# Altium footprint library con-amp.PCBLIB: 295 footprints (part 13 of 19)
Each footprint in its own frame and in the unit in brackets; x right, y up, seen from the top. Pads: shape width x height; smd on the part's side, far side on the other; paste and mask are expansions set on the pad; w line width, h text height; cw(c..) or ccw(c..) is an arc to the next point about the centre after c.
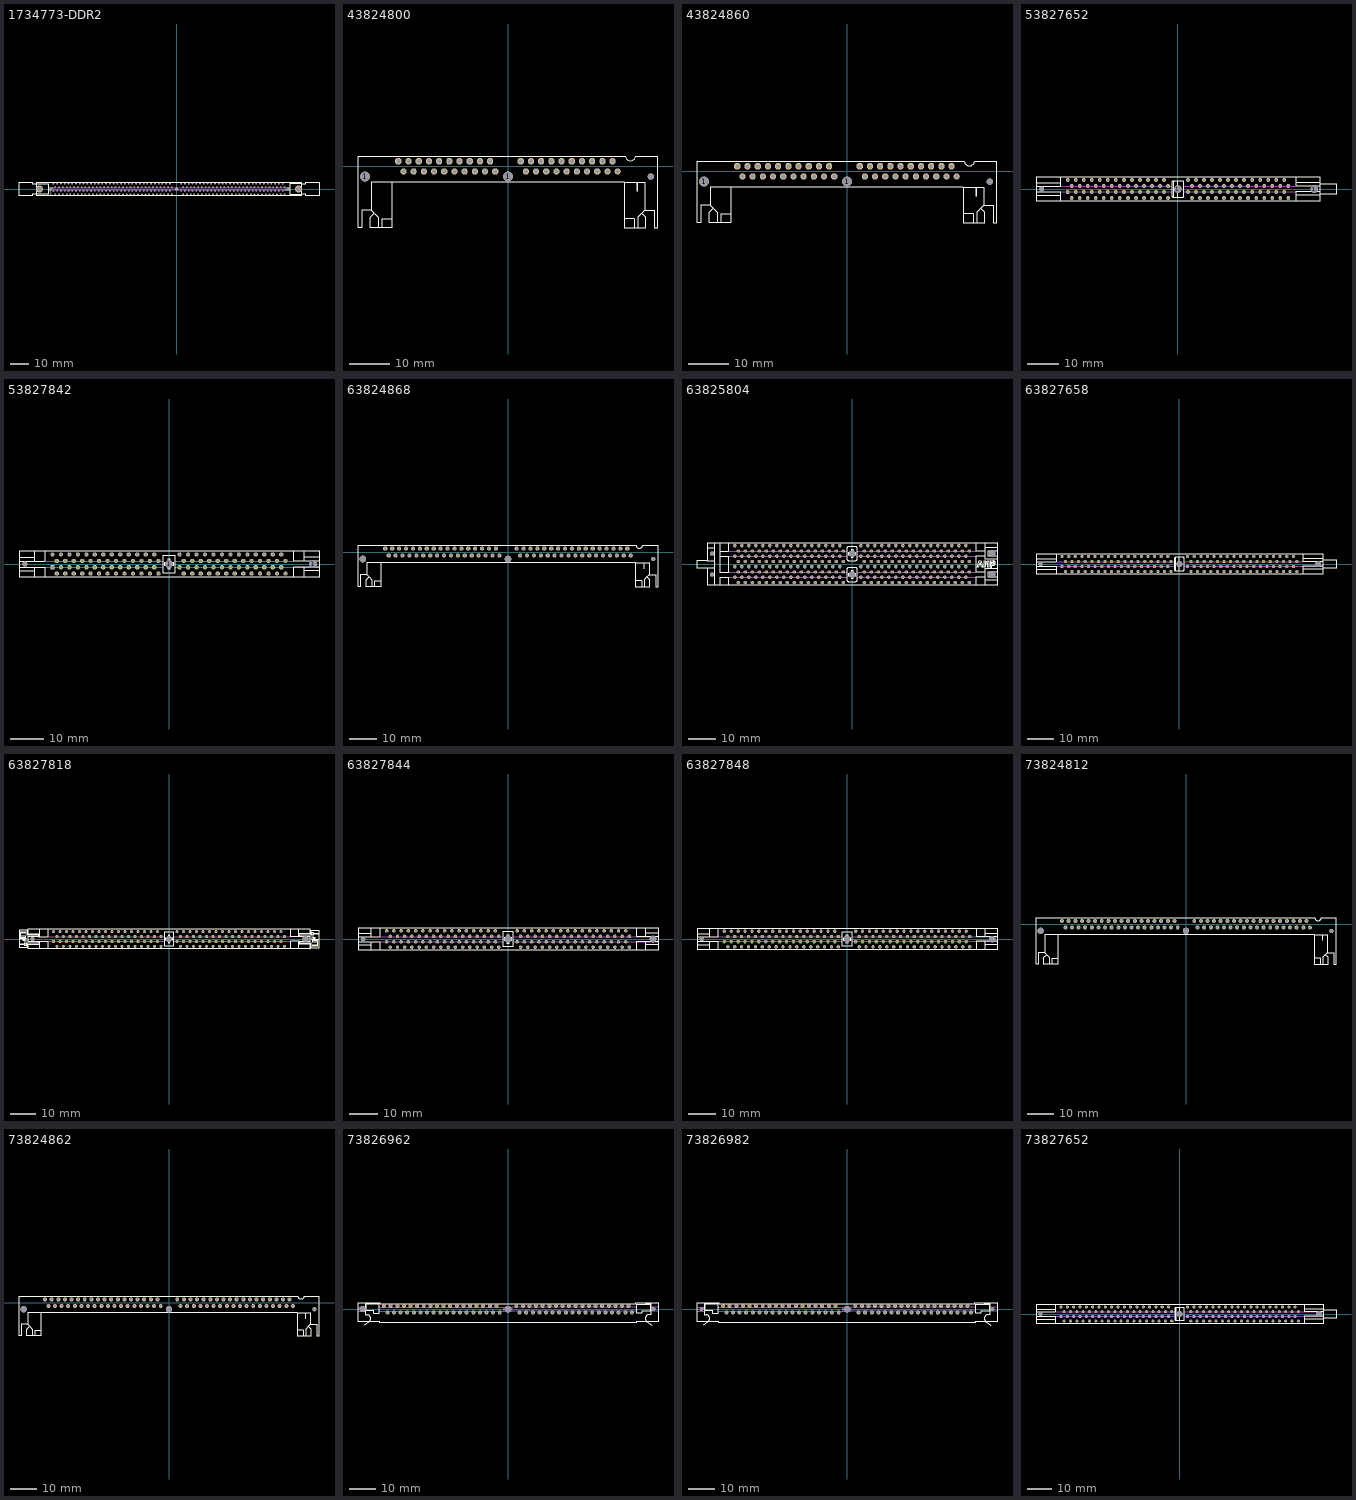
[diagram p12: the footprints below, top view; thin cyan lines are the x and y axes]

## 1734773-DDR2 [mm]
pads (243):
  round 0.9 hole 0.5: 1(-64.5,-2.85) 2(-65.5,-0.95) 3(-62.5,-2.85) 4(-63.5,-0.95) 5(-60.5,-2.85) 6(-61.5,-0.95) 7(-58.5,-2.85) 8(-59.5,-0.95) 9(-56.5,-2.85) 10(-57.5,-0.95) 11(-54.5,-2.85) 12(-55.5,-0.95) 13(-52.5,-2.85) 14(-53.5,-0.95) 15(-50.5,-2.85) 16(-51.5,-0.95) 17(-48.5,-2.85) 18(-49.5,-0.95) 19(-46.5,-2.85) 20(-47.5,-0.95) 21(-44.5,-2.85) 22(-45.5,-0.95) 23(-42.5,-2.85) 24(-43.5,-0.95) 25(-40.5,-2.85) 26(-41.5,-0.95) 27(-38.5,-2.85) 28(-39.5,-0.95) 29(-36.5,-2.85) 30(-37.5,-0.95) 31(-34.5,-2.85) 32(-35.5,-0.95) 33(-32.5,-2.85) 34(-33.5,-0.95) 35(-30.5,-2.85) 36(-31.5,-0.95) 37(-28.5,-2.85) 38(-29.5,-0.95) 39(-26.5,-2.85) 40(-27.5,-0.95) 41(-24.5,-2.85) 42(-25.5,-0.95) 43(-22.5,-2.85) 44(-23.5,-0.95) 45(-20.5,-2.85) 46(-21.5,-0.95) 47(-18.5,-2.85) 48(-19.5,-0.95) 49(-16.5,-2.85) 50(-17.5,-0.95) 51(-14.5,-2.85) 52(-15.5,-0.95) 53(-12.5,-2.85) 54(-13.5,-0.95) 55(-10.5,-2.85) 56(-11.5,-0.95) 57(-8.5,-2.85) 58(-9.5,-0.95) 59(-6.5,-2.85) 60(-7.5,-0.95) 61(-4.5,-2.85) 62(-5.5,-0.95) 63(-2.5,-2.85) 64(-3.5,-0.95) 65(3.5,-2.85) 66(2.5,-0.95) 67(5.5,-2.85) 68(4.5,-0.95) 69(7.5,-2.85) 70(6.5,-0.95) 71(9.5,-2.85) 72(8.5,-0.95) 73(11.5,-2.85) 74(10.5,-0.95) 75(13.5,-2.85) 76(12.5,-0.95) 77(15.5,-2.85) 78(14.5,-0.95) 79(17.5,-2.85) 80(16.5,-0.95) 81(19.5,-2.85) 82(18.5,-0.95) 83(21.5,-2.85) 84(20.5,-0.95) 85(23.5,-2.85) 86(22.5,-0.95) 87(25.5,-2.85) 88(24.5,-0.95) 89(27.5,-2.85) 90(26.5,-0.95) 91(29.5,-2.85) 92(28.5,-0.95) 93(31.5,-2.85) 94(30.5,-0.95) 95(33.5,-2.85) 96(32.5,-0.95) 97(35.5,-2.85) 98(34.5,-0.95) 99(37.5,-2.85) 100(36.5,-0.95) 101(39.5,-2.85) 102(38.5,-0.95) 103(41.5,-2.85) 104(40.5,-0.95) 105(43.5,-2.85) 106(42.5,-0.95) 107(45.5,-2.85) 108(44.5,-0.95) 109(47.5,-2.85) 110(46.5,-0.95) 111(49.5,-2.85) 112(48.5,-0.95) 113(51.5,-2.85) 114(50.5,-0.95) 115(53.5,-2.85) 116(52.5,-0.95) 117(55.5,-2.85) 118(54.5,-0.95) 119(57.5,-2.85) 120(56.5,-0.95) 121(-64.5,0.95) 122(-65.5,2.85) 123(-62.5,0.95) 124(-63.5,2.85) 125(-60.5,0.95) 126(-61.5,2.85) 127(-58.5,0.95) 128(-59.5,2.85) 129(-56.5,0.95) 130(-57.5,2.85) 131(-54.5,0.95) 132(-55.5,2.85) 133(-52.5,0.95) 134(-53.5,2.85) 135(-50.5,0.95) 136(-51.5,2.85) 137(-48.5,0.95) 138(-49.5,2.85) 139(-46.5,0.95) 140(-47.5,2.85) 141(-44.5,0.95) 142(-45.5,2.85) 143(-42.5,0.95) 144(-43.5,2.85) 145(-40.5,0.95) 146(-41.5,2.85) 147(-38.5,0.95) 148(-39.5,2.85) 149(-36.5,0.95) 150(-37.5,2.85) 151(-34.5,0.95) 152(-35.5,2.85) 153(-32.5,0.95) 154(-33.5,2.85) 155(-30.5,0.95) 156(-31.5,2.85) 157(-28.5,0.95) 158(-29.5,2.85) 159(-26.5,0.95) 160(-27.5,2.85) 161(-24.5,0.95) 162(-25.5,2.85) 163(-22.5,0.95) 164(-23.5,2.85) 165(-20.5,0.95) 166(-21.5,2.85) 167(-18.5,0.95) 168(-19.5,2.85) 169(-16.5,0.95) 170(-17.5,2.85) 171(-14.5,0.95) 172(-15.5,2.85) 173(-12.5,0.95) 174(-13.5,2.85) 175(-10.5,0.95) 176(-11.5,2.85) 177(-8.5,0.95) 178(-9.5,2.85) 179(-6.5,0.95) 180(-7.5,2.85) 181(-4.5,0.95) 182(-5.5,2.85) 183(-2.5,0.95) 184(-3.5,2.85) 185(3.5,0.95) 186(2.5,2.85) 187(5.5,0.95) 188(4.5,2.85) 189(7.5,0.95) 190(6.5,2.85) 191(9.5,0.95) 192(8.5,2.85) 193(11.5,0.95) 194(10.5,2.85) 195(13.5,0.95) 196(12.5,2.85) 197(15.5,0.95) 198(14.5,2.85) 199(17.5,0.95) 200(16.5,2.85) 201(19.5,0.95) 202(18.5,2.85) 203(21.5,0.95) 204(20.5,2.85) 205(23.5,0.95) 206(22.5,2.85) 207(25.5,0.95) 208(24.5,2.85) 209(27.5,0.95) 210(26.5,2.85) 211(29.5,0.95) 212(28.5,2.85) 213(31.5,0.95) 214(30.5,2.85) 215(33.5,0.95) 216(32.5,2.85) 217(35.5,0.95) 218(34.5,2.85) 219(37.5,0.95) 220(36.5,2.85) 221(39.5,0.95) 222(38.5,2.85) 223(41.5,0.95) 224(40.5,2.85) 225(43.5,0.95) 226(42.5,2.85) 227(45.5,0.95) 228(44.5,2.85) 229(47.5,0.95) 230(46.5,2.85) 231(49.5,0.95) 232(48.5,2.85) 233(51.5,0.95) 234(50.5,2.85) 235(53.5,0.95) 236(52.5,2.85) 237(55.5,0.95) 238(54.5,2.85) 239(57.5,0.95) 240(56.5,2.85)
  round 3.81 hole 2.8: M1(-73,0) M3(65,0)
  round 1.5 hole 0.8: M2(0,0)
Top Overlay:
  lines w0.203: -74.35,-2.9 -68.3,-2.9 -68.3,2.875 -74.325,2.875 ; -68.25,-0.75 -66.75,-0.75 ; -68.25,0.75 -65.5,0.75 ; 57.5,-0.75 60.25,-0.75 ; 58.75,0.75 60.25,0.75 ; 66.35,-2.875 60.3,-2.875 60.3,2.875 66.35,2.875 ; -83.85,-3.65 -76.8,-3.65 -76.8,-2.875 -74.65,-2.875 -74.65,2.875 -76.8,2.875 -76.8,3.65 -83.85,3.65 -83.85,-3.65 ; -74.45,-3.65 66.45,-3.65 66.45,3.65 -74.45,3.65 -74.45,-3.65 ; 66.65,-2.875 68.8,-2.875 68.8,-3.65 75.85,-3.65 75.85,3.65 68.8,3.65 68.8,2.875 66.65,2.875 66.65,-2.875
  text "1" at -67.5,-3 h1.51
Mechanical 16:
  lines w0.203: -66.75,-0.75 57.5,-0.75 ; -65.5,0.75 58.75,0.75

## 43824800 [mil]
pads (43):
  round 96 hole 96: 1(-1400,-100) 1(0,-100)
  round 60 hole 40: 1(1075,-50)
  round 62 hole 62: 1(1400,-100)
  oct 60x60 hole 40: 2(1025,50) 3(975,-50) 4(925,50) 5(875,-50) 6(825,50) 7(775,-50) 8(725,50) 9(675,-50) 10(625,50) 11(575,-50) 12(525,50) 13(475,-50) 14(425,50) 15(375,-50) 16(325,50) 17(275,-50) 18(225,50) 19(175,-50) 20(125,50) 21(-125,-50) 22(-175,50) 23(-225,-50) 24(-275,50) 25(-325,-50) 26(-375,50) 27(-425,-50) 28(-475,50) 29(-525,-50) 30(-575,50) 31(-625,-50) 32(-675,50) 33(-725,-50) 34(-775,50) 35(-825,-50) 36(-875,50) 37(-925,-50) 38(-975,50) 39(-1025,-50) 40(-1075,50)
Top Overlay:
  rectangle: 1260,-245 1275,-155
  lines w6: -1340,-430 -1340,-155 -1140,-155 ; -1310,-460 -1270,-500 -1270,-600 ; -1235,-600 -1235,-515 -1140,-515 ; 1140,-515 1235,-515 1235,-600 ; 1140,-155 1340,-155 1340,-430 ; 1270,-600 1270,-500 1310,-460
  lines w10: 1150,98 -1470,98 -1470,-602 -1435,-602 -1435,-430 -1340,-430 -1310,-460 -1350,-500 -1350,-602 -1140,-602 -1140,-515 -1140,-157 1140,-157 1140,-515 1140,-602 1350,-602 1350,-500 1310,-460 1340,-430 1435,-430 1435,-602 1470,-602 1470,98 1250,98
  lines w12: 1150,97.05 ccw(c1200,107.05) 1250,97.05

## 43824860 [mil]
pads (43):
  round 96 hole 96: 1(-1400,-100) 1(0,-100)
  round 60 hole 40: 1(1075,-50)
  round 62 hole 62: 1(1400,-100)
  oct 60x60 hole 40: 2(1025,50) 3(975,-50) 4(925,50) 5(875,-50) 6(825,50) 7(775,-50) 8(725,50) 9(675,-50) 10(625,50) 11(575,-50) 12(525,50) 13(475,-50) 14(425,50) 15(375,-50) 16(325,50) 17(275,-50) 18(225,50) 19(175,-50) 20(125,50) 21(-125,-50) 22(-175,50) 23(-225,-50) 24(-275,50) 25(-325,-50) 26(-375,50) 27(-425,-50) 28(-475,50) 29(-525,-50) 30(-575,50) 31(-625,-50) 32(-675,50) 33(-725,-50) 34(-775,50) 35(-825,-50) 36(-875,50) 37(-925,-50) 38(-975,50) 39(-1025,-50) 40(-1075,50)
Top Overlay:
  rectangle: 1260,-245 1275,-155
  lines w6: -1340,-330 -1340,-155 -1140,-155 ; -1310,-360 -1270,-400 -1270,-500 ; -1235,-500 -1235,-415 -1140,-415 ; 1140,-415 1235,-415 1235,-500 ; 1140,-155 1340,-155 1340,-330 ; 1270,-500 1270,-400 1310,-360
  lines w10: 1150,98 -1470,98 -1470,-502 -1435,-502 -1435,-330 -1340,-330 -1310,-360 -1350,-400 -1350,-502 -1140,-502 -1140,-415 -1140,-157 1140,-157 1140,-415 1140,-502 1350,-502 1350,-400 1310,-360 1340,-330 1435,-330 1435,-502 1470,-502 1470,98 1250,98
  lines w12: 1150,96.06 ccw(c1200,106.06) 1250,96.06

## 53827652 [mil]
pads (107):
  round 62 hole 62: 1(-1700,0)
  round 48 hole 32: 1(-1375,-37.5)
  round 93 hole 93: 1(0,0) 1(1700,0)
  oct 48x48 hole 32: 2(-1325,-112.5) 3(-1275,-37.5) 4(-1225,-112.5) 5(-1175,-37.5) 6(-1125,-112.5) 7(-1075,-37.5) 8(-1025,-112.5) 9(-975,-37.5) 10(-925,-112.5) 11(-875,-37.5) 12(-825,-112.5) 13(-775,-37.5) 14(-725,-112.5) 15(-675,-37.5) 16(-625,-112.5) 17(-575,-37.5) 18(-525,-112.5) 19(-475,-37.5) 20(-425,-112.5) 21(-375,-37.5) 22(-325,-112.5) 23(-275,-37.5) 24(-225,-112.5) 25(-175,-37.5) 26(-125,-112.5) 27(125,-37.5) 28(175,-112.5) 29(225,-37.5) 30(275,-112.5) 31(325,-37.5) 32(375,-112.5) 33(425,-37.5) 34(475,-112.5) 35(525,-37.5) 36(575,-112.5) 37(625,-37.5) 38(675,-112.5) 39(725,-37.5) 40(775,-112.5) 41(825,-37.5) 42(875,-112.5) 43(925,-37.5) 44(975,-112.5) 45(1025,-37.5) 46(1075,-112.5) 47(1125,-37.5) 48(1175,-112.5) 49(1225,-37.5) 50(1275,-112.5) 51(1325,-37.5) 52(1375,-112.5) 53(-1375,112.5) 54(-1325,37.5) 55(-1275,112.5) 56(-1225,37.5) 57(-1175,112.5) 58(-1125,37.5) 59(-1075,112.5) 60(-1025,37.5) 61(-975,112.5) 62(-925,37.5) 63(-875,112.5) 64(-825,37.5) 65(-775,112.5) 66(-725,37.5) 67(-675,112.5) 68(-625,37.5) 69(-575,112.5) 70(-525,37.5) 71(-475,112.5) 72(-425,37.5) 73(-375,112.5) 74(-325,37.5) 75(-275,112.5) 76(-225,37.5) 77(-175,112.5) 78(-125,37.5) 79(125,112.5) 80(175,37.5) 81(225,112.5) 82(275,37.5) 83(325,112.5) 84(375,37.5) 85(425,112.5) 86(475,37.5) 87(525,112.5) 88(575,37.5) 89(625,112.5) 90(675,37.5) 91(725,112.5) 92(775,37.5) 93(825,112.5) 94(875,37.5) 95(925,112.5) 96(975,37.5) 97(1025,112.5) 98(1075,37.5) 99(1125,112.5) 100(1175,37.5) 101(1225,112.5) 102(1275,37.5) 103(1325,112.5) 104(1375,37.5)
Top Overlay:
  lines w10: -1770,-35 -1470,-35 ; -1770,35 -1470,35 ; -1467,-150 -1467,-35 ; -1467,35 -1467,152 ; 1467,-150 1467,-35 ; 1467,35 1467,152 ; 1470,-35 1770,-35 ; 1470,35 1770,35 ; 1775,-65 1970,-65 1970,65 1775,65 ; -55,-100 -60,-100 cw(c-60,-85) -75,-85 -75,85 cw(c-60,85) -60,100 -55,100 ; -55,-100 0,-100 ; -55,-100 -55,100 ; -55,100 0,100 ; 0,-100 60,-100 ccw(c60,-85) 75,-85 75,85 ccw(c60,85) 60,100 0,100 ; 0,-100 0,100
  lines w12: -1470,-80 -1770,-80 ; -1470,80 -1770,80 ; 1470,-80 1770,-80 ; 1470,80 1770,80 ; -1770,-80 -1770,-35 -1770,35 -1770,80 ; -1770,-80 -1770,-153 1770,-153 1770,-80 ; -1770,80 -1770,155 1770,155 1770,80 ; 1770,-80 1770,-35 1770,35 1770,80
Mechanical 16:
  lines w10: -1465,-35 -75,-35 ; -1465,35 -75,35 ; 75,-35 1465,-35 ; 75,35 1465,35

## 53827842 [mil]
pads (107):
  round 62 hole 62: 1(-1700,0)
  rect 50x50 hole 32: 1(-1375,-37.5)
  round 93 hole 93: 1(0,0) 1(1700,0)
  oct 50x50 hole 32: 2(-1325,-112.5) 3(-1275,-37.5) 4(-1225,-112.5) 5(-1175,-37.5) 6(-1125,-112.5) 7(-1075,-37.5) 8(-1025,-112.5) 9(-975,-37.5) 10(-925,-112.5) 11(-875,-37.5) 12(-825,-112.5) 13(-775,-37.5) 14(-725,-112.5) 15(-675,-37.5) 16(-625,-112.5) 17(-575,-37.5) 18(-525,-112.5) 19(-475,-37.5) 20(-425,-112.5) 21(-375,-37.5) 22(-325,-112.5) 23(-275,-37.5) 24(-225,-112.5) 25(-175,-37.5) 26(-125,-112.5) 27(125,-37.5) 28(175,-112.5) 29(225,-37.5) 30(275,-112.5) 31(325,-37.5) 32(375,-112.5) 33(425,-37.5) 34(475,-112.5) 35(525,-37.5) 36(575,-112.5) 37(625,-37.5) 38(675,-112.5) 39(725,-37.5) 40(775,-112.5) 41(825,-37.5) 42(875,-112.5) 43(925,-37.5) 44(975,-112.5) 45(1025,-37.5) 46(1075,-112.5) 47(1125,-37.5) 48(1175,-112.5) 49(1225,-37.5) 50(1275,-112.5) 51(1325,-37.5) 52(1375,-112.5) 53(-1375,112.5) 54(-1325,37.5) 55(-1275,112.5) 56(-1225,37.5) 57(-1175,112.5) 58(-1125,37.5) 59(-1075,112.5) 60(-1025,37.5) 61(-975,112.5) 62(-925,37.5) 63(-875,112.5) 64(-825,37.5) 65(-775,112.5) 66(-725,37.5) 67(-675,112.5) 68(-625,37.5) 69(-575,112.5) 70(-525,37.5) 71(-475,112.5) 72(-425,37.5) 73(-375,112.5) 74(-325,37.5) 75(-275,112.5) 76(-225,37.5) 77(-175,112.5) 78(-125,37.5) 79(125,112.5) 80(175,37.5) 81(225,112.5) 82(275,37.5) 83(325,112.5) 84(375,37.5) 85(425,112.5) 86(475,37.5) 87(525,112.5) 88(575,37.5) 89(625,112.5) 90(675,37.5) 91(725,112.5) 92(775,37.5) 93(825,112.5) 94(875,37.5) 95(925,112.5) 96(975,37.5) 97(1025,112.5) 98(1075,37.5) 99(1125,112.5) 100(1175,37.5) 101(1225,112.5) 102(1275,37.5) 103(1325,112.5) 104(1375,37.5)
Top Overlay:
  lines w10: -1770,-35 -1470,-35 ; -1770,35 -1470,35 ; -1592,-150 -1592,-35 ; -1592,35 -1592,152 ; -1467,-150 -1467,-35 ; -1467,35 -1467,152 ; 1467,-150 1467,-35 ; 1467,35 1467,152 ; 1470,-35 1770,-35 ; 1470,35 1770,35 ; 1592,-150 1592,-35 ; 1592,35 1592,152 ; -75,-100 -75,100 75,100 75,-100 -75,-100 ; -55,-15 -55,15 -15,15 -15,55 15,55 15,15 55,15 55,-15 15,-15 15,-55 -15,-55 -15,-15 -55,-15
  lines w12: -1770,-153 1770,-153 1770,-80 ; -1770,-150 -1770,155 1770,155 1770,80 ; -1765,-80 -1595,-80 ; -1765,80 -1595,80 ; 1595,-80 1770,-80 ; 1595,80 1770,80 ; 1770,-80 1770,-35 1770,35 1770,80
Mechanical 16:
  lines w10: -1465,-35 -75,-35 ; -1465,35 -75,35 ; 75,-35 1765,-35 ; 75,35 1465,35

## 63824868 [mil]
pads (71):
  round 96 hole 96: 1(-2100,-100) 1(0,-100)
  round 60 hole 40: 1(1775,-50)
  round 62 hole 62: 1(2100,-100)
  oct 60x60 hole 40: 2(1725,50) 3(1675,-50) 4(1625,50) 5(1575,-50) 6(1525,50) 7(1475,-50) 8(1425,50) 9(1375,-50) 10(1325,50) 11(1275,-50) 12(1225,50) 13(1175,-50) 14(1125,50) 15(1075,-50) 16(1025,50) 17(975,-50) 18(925,50) 19(875,-50) 20(825,50) 21(775,-50) 22(725,50) 23(675,-50) 24(625,50) 25(575,-50) 26(525,50) 27(475,-50) 28(425,50) 29(375,-50) 30(325,50) 31(275,-50) 32(225,50) 33(175,-50) 34(125,50) 35(-125,-50) 36(-175,50) 37(-225,-50) 38(-275,50) 39(-325,-50) 40(-375,50) 41(-425,-50) 42(-475,50) 43(-525,-50) 44(-575,50) 45(-625,-50) 46(-675,50) 47(-725,-50) 48(-775,50) 49(-825,-50) 50(-875,50) 51(-925,-50) 52(-975,50) 53(-1025,-50) 54(-1075,50) 55(-1125,-50) 56(-1175,50) 57(-1225,-50) 58(-1275,50) 59(-1325,-50) 60(-1375,50) 61(-1425,-50) 62(-1475,50) 63(-1525,-50) 64(-1575,50) 65(-1625,-50) 66(-1675,50) 67(-1725,-50) 68(-1775,50)
Top Overlay:
  rectangle: 1960,-245 1975,-155
  lines w6: -2040,-330 -2040,-155 -1840,-155 ; -2010,-360 -1970,-400 -1970,-500 ; -1935,-500 -1935,-415 -1840,-415 ; 1840,-415 1935,-415 1935,-500 ; 1840,-155 2040,-155 2040,-330 ; 1970,-500 1970,-400 2010,-360
  lines w10: 1850,98 -2170,98 -2170,-502 -2135,-502 -2135,-330 -2040,-330 -2010,-360 -2050,-400 -2050,-502 -1840,-502 -1840,-415 -1840,-157 1840,-157 1840,-415 1840,-502 2050,-502 2050,-400 2010,-360 2040,-330 2135,-330 2135,-502 2170,-502 2170,98 1950,98
  lines w12: 1850,96.06 ccw(c1900,106.06) 1950,96.06

## 63825804 [mil]
pads (262):
  round 62 hole 62: 1(-2000,-150) 1(-2000,150)
  round 48 hole 32: 1(-1675,-187.5)
  round 93 hole 93: 1(0,-150) 1(0,150) 1(2000,-150) 1(2000,150)
  oct 48x48 hole 32: 2(-1625,-262.5) 3(-1575,-187.5) 4(-1525,-262.5) 5(-1475,-187.5) 6(-1425,-262.5) 7(-1375,-187.5) 8(-1325,-262.5) 9(-1275,-187.5) 10(-1225,-262.5) 11(-1175,-187.5) 12(-1125,-262.5) 13(-1075,-187.5) 14(-1025,-262.5) 15(-975,-187.5) 16(-925,-262.5) 17(-875,-187.5) 18(-825,-262.5) 19(-775,-187.5) 20(-725,-262.5) 21(-675,-187.5) 22(-625,-262.5) 23(-575,-187.5) 24(-525,-262.5) 25(-475,-187.5) 26(-425,-262.5) 27(-375,-187.5) 28(-325,-262.5) 29(-275,-187.5) 30(-225,-262.5) 31(-175,-187.5) 32(-125,-262.5) 33(125,-187.5) 34(175,-262.5) 35(225,-187.5) 36(275,-262.5) 37(325,-187.5) 38(375,-262.5) 39(425,-187.5) 40(475,-262.5) 41(525,-187.5) 42(575,-262.5) 43(625,-187.5) 44(675,-262.5) 45(725,-187.5) 46(775,-262.5) 47(825,-187.5) 48(875,-262.5) 49(925,-187.5) 50(975,-262.5) 51(1025,-187.5) 52(1075,-262.5) 53(1125,-187.5) 54(1175,-262.5) 55(1225,-187.5) 56(1275,-262.5) 57(1325,-187.5) 58(1375,-262.5) 59(1425,-187.5) 60(1475,-262.5) 61(1525,-187.5) 62(1575,-262.5) 63(1625,-187.5) 64(1675,-262.5) 65(-1675,-37.5) 66(-1625,-112.5) 67(-1575,-37.5) 68(-1525,-112.5) 69(-1475,-37.5) 70(-1425,-112.5) 71(-1375,-37.5) 72(-1325,-112.5) 73(-1275,-37.5) 74(-1225,-112.5) 75(-1175,-37.5) 76(-1125,-112.5) 77(-1075,-37.5) 78(-1025,-112.5) 79(-975,-37.5) 80(-925,-112.5) 81(-875,-37.5) 82(-825,-112.5) 83(-775,-37.5) 84(-725,-112.5) 85(-675,-37.5) 86(-625,-112.5) 87(-575,-37.5) 88(-525,-112.5) 89(-475,-37.5) 90(-425,-112.5) 91(-375,-37.5) 92(-325,-112.5) 93(-275,-37.5) 94(-225,-112.5) 95(-175,-37.5) 96(-125,-112.5) 97(125,-37.5) 98(175,-112.5) 99(225,-37.5) 100(275,-112.5) 101(325,-37.5) 102(375,-112.5) 103(425,-37.5) 104(475,-112.5) 105(525,-37.5) 106(575,-112.5) 107(625,-37.5) 108(675,-112.5) 109(725,-37.5) 110(775,-112.5) 111(825,-37.5) 112(875,-112.5) 113(925,-37.5) 114(975,-112.5) 115(1025,-37.5) 116(1075,-112.5) 117(1125,-37.5) 118(1175,-112.5) 119(1225,-37.5) 120(1275,-112.5) 121(1325,-37.5) 122(1375,-112.5) 123(1425,-37.5) 124(1475,-112.5) 125(1525,-37.5) 126(1575,-112.5) 127(1625,-37.5) 128(1675,-112.5) 129(-1675,112.5) 130(-1625,37.5) 131(-1575,112.5) 132(-1525,37.5) 133(-1475,112.5) 134(-1425,37.5) 135(-1375,112.5) 136(-1325,37.5) 137(-1275,112.5) 138(-1225,37.5) 139(-1175,112.5) 140(-1125,37.5) 141(-1075,112.5) 142(-1025,37.5) 143(-975,112.5) 144(-925,37.5) 145(-875,112.5) 146(-825,37.5) 147(-775,112.5) 148(-725,37.5) 149(-675,112.5) 150(-625,37.5) 151(-575,112.5) 152(-525,37.5) 153(-475,112.5) 154(-425,37.5) 155(-375,112.5) 156(-325,37.5) 157(-275,112.5) 158(-225,37.5) 159(-175,112.5) 160(-125,37.5) 161(125,112.5) 162(175,37.5) 163(225,112.5) 164(275,37.5) 165(325,112.5) 166(375,37.5) 167(425,112.5) 168(475,37.5) 169(525,112.5) 170(575,37.5) 171(625,112.5) 172(675,37.5) 173(725,112.5) 174(775,37.5) 175(825,112.5) 176(875,37.5) 177(925,112.5) 178(975,37.5) 179(1025,112.5) 180(1075,37.5) 181(1125,112.5) 182(1175,37.5) 183(1225,112.5) 184(1275,37.5) 185(1325,112.5) 186(1375,37.5) 187(1425,112.5) 188(1475,37.5) 189(1525,112.5) 190(1575,37.5) 191(1625,112.5) 192(1675,37.5) 193(-1675,262.5) 194(-1625,187.5) 195(-1575,262.5) 196(-1525,187.5) 197(-1475,262.5) 198(-1425,187.5) 199(-1375,262.5) 200(-1325,187.5) 201(-1275,262.5) 202(-1225,187.5) 203(-1175,262.5) 204(-1125,187.5) 205(-1075,262.5) 206(-1025,187.5) 207(-975,262.5) 208(-925,187.5) 209(-875,262.5) 210(-825,187.5) 211(-775,262.5) 212(-725,187.5) 213(-675,262.5) 214(-625,187.5) 215(-575,262.5) 216(-525,187.5) 217(-475,262.5) 218(-425,187.5) 219(-375,262.5) 220(-325,187.5) 221(-275,262.5) 222(-225,187.5) 223(-175,262.5) 224(-125,187.5) 225(125,262.5) 226(175,187.5) 227(225,262.5) 228(275,187.5) 229(325,262.5) 230(375,187.5) 231(425,262.5) 232(475,187.5) 233(525,262.5) 234(575,187.5) 235(625,262.5) 236(675,187.5) 237(725,262.5) 238(775,187.5) 239(825,262.5) 240(875,187.5) 241(925,262.5) 242(975,187.5) 243(1025,262.5) 244(1075,187.5) 245(1125,262.5) 246(1175,187.5) 247(1225,262.5) 248(1275,187.5) 249(1325,262.5) 250(1375,187.5) 251(1425,262.5) 252(1475,187.5) 253(1525,262.5) 254(1575,187.5) 255(1625,262.5) 256(1675,187.5)
Top Overlay:
  lines w10: -2065,230 -1970,230 ; -1970,-300 -1970,-50 ; -1970,-5 -1970,-50 ; -1970,0 -1970,50 ; -1970,295 -1970,230 ; -1892,-300 -1892,-185 -1770,-185 ; -1892,2 -1892,0 ; -1892,302 -1892,185 ; -1770,-115 -1892,-115 -1892,0 ; -1770,115 -1892,115 ; -1770,185 -1892,185 ; -1767,-300 -1767,-185 ; -1767,-115 -1767,0 ; -1767,2 -1767,0 ; -1767,115 -1767,0 ; -1767,185 -1767,302 ; 1767,-300 1767,-185 ; 1767,-115 1767,0 ; 1767,2 1767,0 ; 1767,115 1767,0 ; 1767,185 1767,302 ; 1770,-185 1892,-185 ; 1770,-115 1892,-115 ; 1770,115 1892,115 ; 1770,185 1892,185 ; 1892,-300 1892,-185 ; 1892,-70 1892,-115 ; 1892,70 1892,115 ; 1892,302 1892,185 ; 1995,-25 1995,-45 1980,-45 1980,45 2015,45 cw(c2015,12.5) 2015,-20 1995,-20 ; 2070,-185 1937,-185 1937,-115 2070,-115 ; 2070,115 1937,115 1937,185 2070,185 ; -1970,-50 -2070,-50 -2215,-50 -2215,50 -2070,50 -1970,50 ; -1970,50 -1970,230 ; -1892,0 -1892,115 ; -1892,115 -1892,185 ; 1892,-185 1892,-115 ; 1892,115 1892,185 ; -75,-225 -75,-75 cw(c-50,-75) -50,-50 50,-50 cw(c50,-75) 75,-75 75,-225 cw(c50,-225) 50,-250 -50,-250 cw(c-50,-225) -75,-225 ; -75,75 -75,225 cw(c-50,225) -50,250 50,250 cw(c50,225) 75,225 75,75 cw(c50,75) 50,50 -50,50 cw(c-50,75) -75,75 ; -55,-165 -55,-135 -15,-135 -15,-95 15,-95 15,-135 55,-135 55,-165 15,-165 15,-205 -15,-205 -15,-165 -55,-165 ; -55,135 -55,165 -15,165 -15,205 15,205 15,165 55,165 55,135 15,135 15,95 -15,95 -15,135 -55,135 ; 1790,-45 1820,45 1840,45 1870,-45 1855,-45 1840,-5 1820,-5 1805,-45 1790,-45 ; 1825,10 1830,25 1835,10 1825,10 ; 1885,-45 1885,45 1900,45 1920,25 1940,45 1955,45 1955,-45 1940,-45 1940,20 1920,0 1900,20 1900,-45 1885,-45 ; 1995,0 2015,0 ccw(c2015,12.5) 2015,25 1995,25 1995,0